# Altium footprint library DrPCB.PcbLib: 910 footprints (part 18 of 57)
Each footprint in its own frame and in the unit in brackets; x right, y up, seen from the top. Pads: shape width x height; smd on the part's side, far side on the other; paste and mask are expansions set on the pad; w line width, h text height; cw(c..) or ccw(c..) is an arc to the next point about the centre after c.
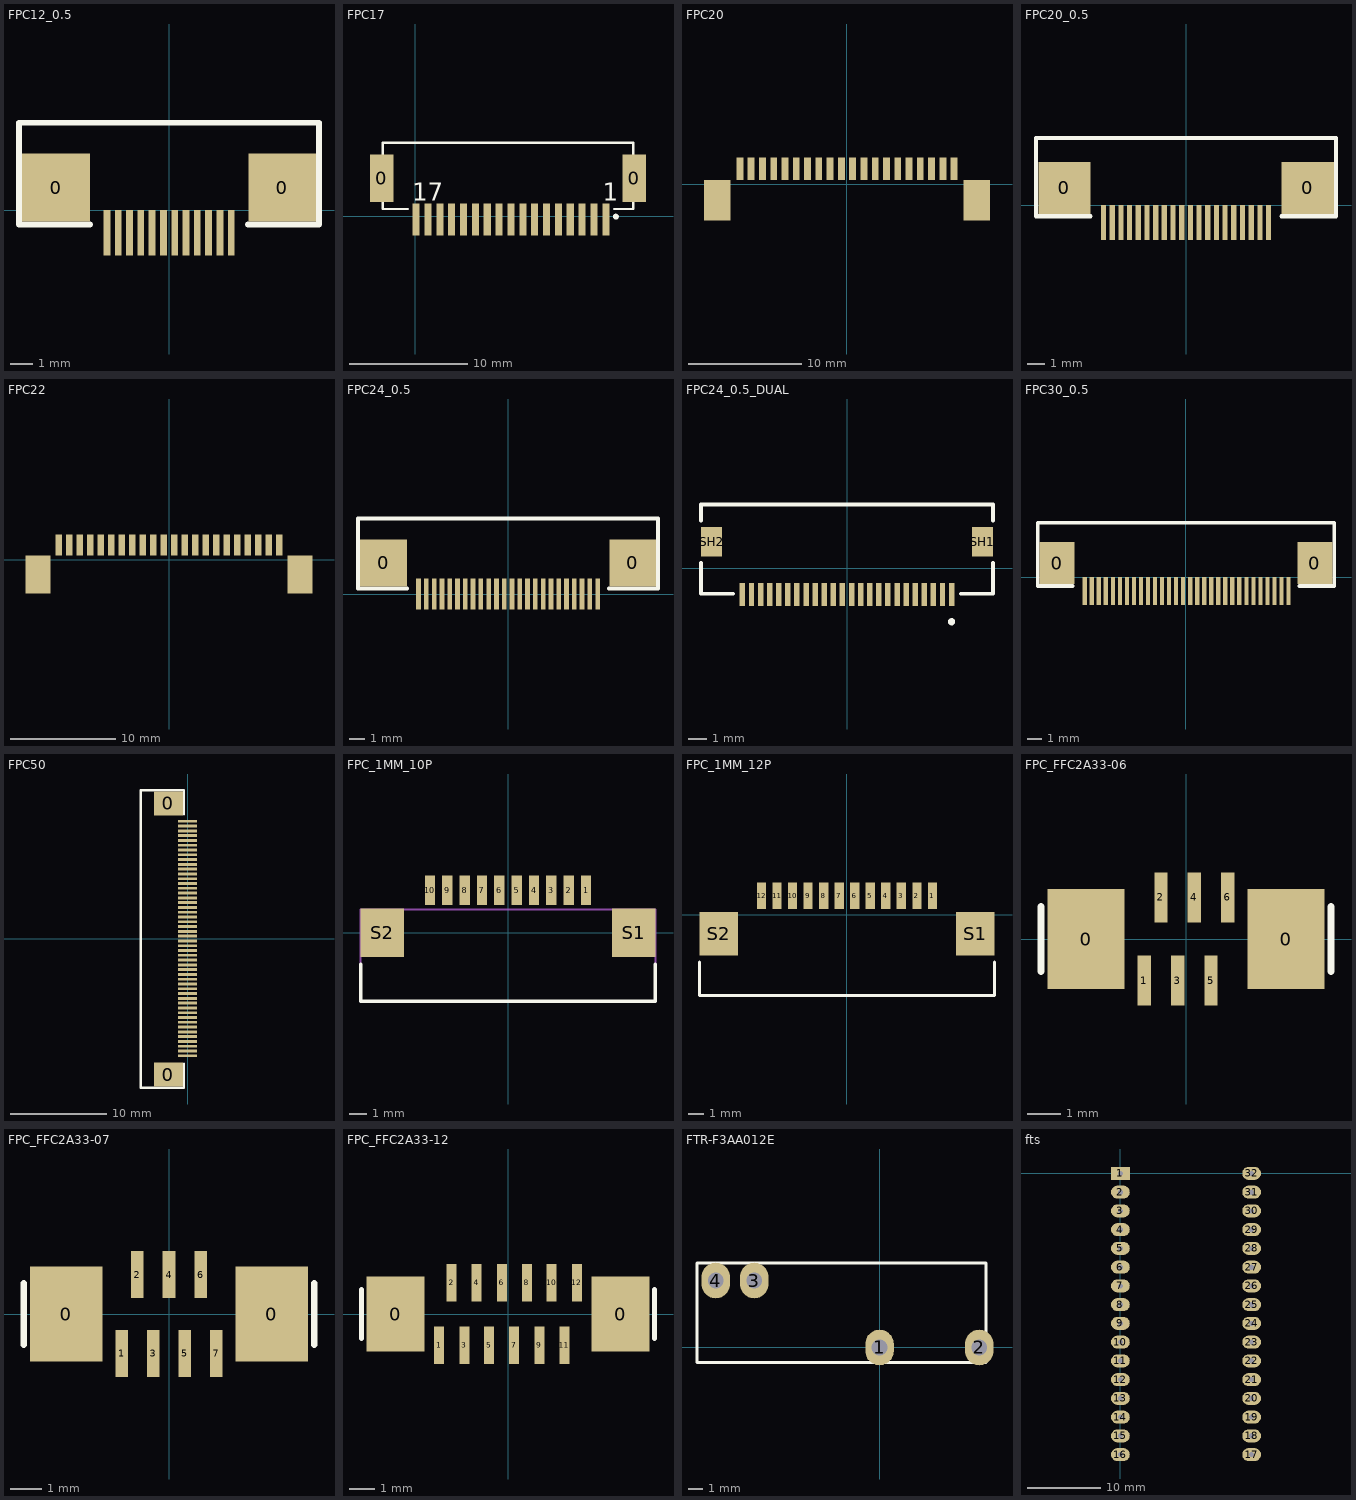
[diagram p17: the footprints below, top view; thin cyan lines are the x and y axes]

## FPC12_0.5 [mm]
pads (14):
  rect 3x3 smd: 0(-5.003,1) 0(5.003,1)
  rect 0.3x2 smd: 1(-2.753,-1) 2(-2.253,-1) 3(-1.753,-1) 4(-1.253,-1) 5(-0.753,-1) 6(-0.253,-1) 7(0.247,-1) 8(0.747,-1) 9(1.247,-1) 10(1.747,-1) 11(2.247,-1) 12(2.747,-1)
Top Overlay:
  lines w0.254: -6.642,3.868 -6.642,-0.632 -3.505,-0.632 ; -6.636,3.868 6.617,3.868 ; 3.492,-0.632 6.629,-0.632 6.629,3.868
3D body "ffc_fpc_affc20-12-050-shb-t.stp": height 2.11, standoff 0.01, extent -5.76,-1.295 5.74,4.04

## FPC17 [mm]
pads (19):
  rect 2x4 smd: 0(-2.84,3.213) 0(18.461,3.213)
  rect 0.6x2.7 smd: 1(16.06,-0.266) 2(15.06,-0.266) 3(14.06,-0.266) 4(13.06,-0.266) 5(12.06,-0.266) 6(11.06,-0.266) 7(10.06,-0.266) 8(9.06,-0.266) 9(8.06,-0.266) 10(7.06,-0.266) 11(6.06,-0.266) 12(5.06,-0.266) 13(4.06,-0.266) 14(3.06,-0.266) 15(2.06,-0.266) 16(1.06,-0.266) 17(0.06,-0.266)
Top Overlay:
  circle w0.25: c16.91,-0.038 r0.125
  lines w0.2: -2.74,1.206 -2.74,0.613 -0.64,0.613 ; -2.74,5.22 -2.74,6.212 18.36,6.212 18.36,5.22 ; 16.761,0.613 18.361,0.613 18.36,1.206
  text "17" at -0.254,1.295 h1.5
  text "1" at 15.811,1.295 h1.5

## FPC20 [mm]
pads (22):
  rect 0.61x2 smd: 1(-9.5,1.4) 2(-8.5,1.4) 3(-7.5,1.4) 4(-6.5,1.4) 5(-5.5,1.4) 6(-4.5,1.4) 7(-3.5,1.4) 8(-2.5,1.4) 9(-1.5,1.4) 10(-0.5,1.4) 11(0.5,1.4) 12(1.5,1.4) 13(2.5,1.4) 14(3.5,1.4) 15(4.5,1.4) 16(5.5,1.4) 17(6.5,1.4) 18(7.5,1.4) 19(8.5,1.4) 20(9.5,1.4)
  rect 2.38x3.6 smd: ""(-11.5,-1.4) ""(11.5,-1.4)

## FPC20_0.5 [mm]
pads (22):
  rect 3x3 smd: 0(-7.003,1) 0(7.003,1)
  rect 0.3x2 smd: 1(-4.753,-1) 2(-4.253,-1) 3(-3.753,-1) 4(-3.253,-1) 5(-2.753,-1) 6(-2.253,-1) 7(-1.753,-1) 8(-1.253,-1) 9(-0.753,-1) 10(-0.253,-1) 11(0.247,-1) 12(0.747,-1) 13(1.247,-1) 14(1.747,-1) 15(2.247,-1) 16(2.747,-1) 17(3.247,-1) 18(3.747,-1) 19(4.247,-1) 20(4.747,-1)
Top Overlay:
  lines w0.254: -5.505,-0.632 -8.642,-0.632 -8.642,3.868 8.617,3.868 ; 5.493,-0.632 8.63,-0.632 8.63,3.868
3D body "ffc_fpc_affc20-20-050-shb-t.stp": height 2.06, standoff -0.04, extent -7.753,-1.437 7.747,3.899

## FPC22 [mm]
pads (24):
  rect 0.61x2 smd: 1(-10.5,1.406) 2(-9.5,1.406) 3(-8.5,1.406) 4(-7.5,1.406) 5(-6.5,1.406) 6(-5.5,1.406) 7(-4.5,1.406) 8(-3.5,1.406) 9(-2.5,1.406) 10(-1.5,1.406) 11(-0.5,1.406) 12(0.5,1.406) 13(1.5,1.406) 14(2.5,1.406) 15(3.5,1.406) 16(4.5,1.406) 17(5.5,1.406) 18(6.5,1.406) 19(7.5,1.406) 20(8.5,1.394) 21(9.5,1.394) 22(10.5,1.394)
  rect 2.38x3.6 smd: ""(-12.5,-1.394) ""(12.5,-1.406)

## FPC24_0.5 [mm]
pads (26):
  rect 3x3 smd: 0(-8,2) 0(8,2)
  rect 0.3x2 smd: 1(-5.75,0) 2(-5.25,0) 3(-4.75,0) 4(-4.25,0) 5(-3.75,0) 6(-3.25,0) 7(-2.75,0) 8(-2.25,0) 9(-1.75,0) 10(-1.25,0) 11(-0.75,0) 12(-0.25,0) 13(0.25,0) 14(0.75,0) 15(1.25,0) 16(1.75,0) 17(2.25,0) 18(2.75,0) 19(3.25,0) 20(3.75,0) 21(4.25,0) 22(4.75,0) 23(5.25,0) 24(5.75,0)
Top Overlay:
  lines w0.254: -6.502,0.368 -9.639,0.368 -9.639,4.868 9.627,4.868 9.627,0.368 6.49,0.368
3D body "ffc_fpc_affc20-24-050-shb-t.stp": height 2.11, standoff 0.01, extent -8.756,-0.34 8.744,4.995

## FPC24_0.5_DUAL [mm]
pads (26):
  rect 0.3x1.25 smd mask+0.05: 1(5.75,-1.448) 2(5.25,-1.448) 3(4.75,-1.448) 4(4.25,-1.448) 5(3.75,-1.448) 6(3.25,-1.448) 7(2.75,-1.448) 8(2.25,-1.448) 9(1.75,-1.448) 10(1.25,-1.448) 11(0.75,-1.448) 12(0.25,-1.448) 13(-0.25,-1.448) 14(-0.75,-1.448) 15(-1.25,-1.448) 16(-1.75,-1.448) 17(-2.25,-1.448) 18(-2.75,-1.448) 19(-3.25,-1.448) 20(-3.75,-1.448) 21(-4.25,-1.448) 22(-4.75,-1.448) 23(-5.25,-1.448) 24(-5.75,-1.448)
  rect 1.15x1.6 smd: SH1(7.445,1.448) SH2(-7.445,1.448)
Top Overlay:
  circle w0.2: c5.75,-2.947 r0.1
  lines w0.2: -8.025,0.298 -8.025,-1.402 -6.25,-1.402 ; -8.025,2.598 -8.025,3.497 8.025,3.497 8.025,2.598 ; 6.25,-1.402 8.025,-1.402 8.025,0.298
3D body "FFC2B29-24-G.stp": height 3.66, standoff -0.05, extent -8.026,-1.772 8.024,3.499

## FPC30_0.5 [mm]
pads (32):
  rect 2.5x3 smd: 0(-9.174,0.997) 0(9.174,0.997)
  rect 0.3x2 smd: 1(-7.204,-0.997) 2(-6.704,-0.997) 3(-6.204,-0.997) 4(-5.704,-0.997) 5(-5.204,-0.997) 6(-4.704,-0.997) 7(-4.204,-0.997) 8(-3.704,-0.997) 9(-3.204,-0.997) 10(-2.704,-0.997) 11(-2.204,-0.997) 12(-1.704,-0.997) 13(-1.204,-0.997) 14(-0.704,-0.997) 15(-0.204,-0.997) 16(0.296,-0.997) 17(0.796,-0.997) 18(1.296,-0.997) 19(1.796,-0.997) 20(2.296,-0.997) 21(2.796,-0.997) 22(3.296,-0.997) 23(3.796,-0.997) 24(4.296,-0.997) 25(4.796,-0.997) 26(5.296,-0.997) 27(5.796,-0.997) 28(6.296,-0.997) 29(6.796,-0.997) 30(7.296,-0.997)
Top Overlay:
  lines w0.254: -10.555,-0.633 -10.555,3.867 ; -10.555,-0.629 -8.047,-0.629 ; -10.549,3.871 10.545,3.871 ; 8.043,-0.629 10.551,-0.629 10.551,3.871
3D body "User Library-FPC0_5MM4_6H30P-H.step": height 2.01, standoff -0.04, extent -10.762,-1.17 10.838,5.43

## FPC50 [mm]
pads (52):
  rect 3x2.5 smd: 0(-1.994,-14.22) 0(-1.994,14.122)
  rect 2x0.3 smd: 1(0,-12.25) 2(0,-11.75) 3(0,-11.25) 4(0,-10.75) 5(0,-10.25) 6(0,-9.75) 7(0,-9.25) 8(0,-8.75) 9(0,-8.25) 10(0,-7.75) 11(0,-7.25) 12(0,-6.75) 13(0,-6.25) 14(0,-5.75) 15(0,-5.25) 16(0,-4.75) 17(0,-4.25) 18(0,-3.75) 19(0,-3.25) 20(0,-2.75) 21(0,-2.25) 22(0,-1.75) 23(0,-1.25) 24(0,-0.75) 25(0,-0.25) 26(0,0.25) 27(0,0.75) 28(0,1.25) 29(0,1.75) 30(0,2.25) 31(0,2.75) 32(0,3.25) 33(0,3.75) 34(0,4.25) 35(0,4.75) 36(0,5.25) 37(0,5.75) 38(0,6.25) 39(0,6.75) 40(0,7.25) 41(0,7.75) 42(0,8.25) 43(0,8.75) 44(0,9.25) 45(0,9.75) 46(0,10.25) 47(0,10.75) 48(0,11.25) 49(0,11.75) 50(0,12.25)
Top Overlay:
  lines w0.254: -4.868,-15.596 -4.868,15.5 -0.368,15.5 -0.368,12.992 ; -4.864,-15.602 -0.364,-15.602 ; -0.368,-15.602 -0.368,-13.094
3D body "ffc_fpc_affc20-50-050-shb-t.stp": height 2.06, standoff -0.04, extent -4.78,-15.25 0.556,15.25

## FPC_1MM_10P [mm]
pads (12):
  rect 0.6x1.7 smd: 1(4.5,2.45) 2(3.5,2.45) 3(2.5,2.45) 4(1.5,2.45) 5(0.5,2.45) 6(-0.5,2.45) 7(-1.5,2.45) 8(-2.5,2.45) 9(-3.5,2.45) 10(-4.5,2.45)
  rect 2.5x2.8 smd: S1(7.25,0) S2(-7.25,0)
Top Overlay:
  lines w0.2: -8.5,-1.8 -8.5,-3.95 8.5,-3.95 8.5,-1.8
Mechanical 13:
  lines w0.1: -8.5,-4 8.5,-4 ; -8.5,-3.95 -8.5,1.35 8.5,1.35 8.5,-3.95
3D body "68611014122.stp": height 3.01, standoff 0.01, extent -8.5,-4.05 8.5,3.05

## FPC_1MM_12P [mm]
pads (14):
  rect 0.6x1.7 smd: 1(5.497,1.225) 2(4.497,1.225) 3(3.497,1.225) 4(2.497,1.225) 5(1.497,1.225) 6(0.497,1.225) 7(-0.503,1.225) 8(-1.503,1.225) 9(-2.503,1.225) 10(-3.503,1.225) 11(-4.497,1.225) 12(-5.497,1.225)
  rect 2.5x2.8 smd: S1(8.247,-1.225) S2(-8.247,-1.225)
Top Overlay:
  lines w0.2: -9.497,-5.175 -9.497,-3.025 ; -9.493,-3.025 -9.493,-5.175 9.497,-5.175 9.497,-3.025
3D body "1-84953-2.stp": height 2.59, standoff -0.07, extent -9.96,-5.053 9.96,1.497

## FPC_FFC2A33-06 [mm]
pads (8):
  rect 2.3x3 smd paste-0.2: 0(-3,0) 0(3,0)
  rect 0.4x1.5 smd paste-0.05: 1(-1.25,-1.25) 2(-0.75,1.25) 3(-0.25,-1.25) 4(0.25,1.25) 5(0.75,-1.25) 6(1.25,1.25)
Top Overlay:
  lines w0.2: -4.35,-0.975 -4.35,0.975 ; 4.35,-0.975 4.35,0.975
3D body "FFC2A33-06-T-R.stp": height 4.46, standoff -0.04, extent -4.369,-1.6 4.331,1.6

## FPC_FFC2A33-07 [mm]
pads (9):
  rect 2.3x3 smd paste-0.2: 0(-3.25,0) 0(3.25,0)
  rect 0.4x1.5 smd paste-0.05: 1(-1.5,-1.25) 2(-1,1.25) 3(-0.5,-1.25) 4(0,1.25) 5(0.5,-1.25) 6(1,1.25) 7(1.5,-1.25)
Top Overlay:
  lines w0.2: -4.6,-0.975 -4.6,0.975 ; 4.6,-0.975 4.6,0.975
3D body "FFC2A33-07-T-R.stp": height 4.5, standoff 0, extent -4.6,-1.6 4.6,1.6

## FPC_FFC2A33-12 [mm]
pads (14):
  rect 2.3x3 smd paste-0.2: 0(-4.5,0) 0(4.5,0)
  rect 0.4x1.5 smd paste-0.05: 1(-2.75,-1.25) 2(-2.25,1.25) 3(-1.75,-1.25) 4(-1.25,1.25) 5(-0.75,-1.25) 6(-0.25,1.25) 7(0.25,-1.25) 8(0.75,1.25) 9(1.25,-1.25) 10(1.75,1.25) 11(2.25,-1.25) 12(2.75,1.25)
Top Overlay:
  lines w0.2: -5.85,-0.975 -5.85,0.975 ; 5.85,-0.975 5.85,0.975
3D body "FFC2A33-12-T-R.stp": height 4.46, standoff -0.04, extent -5.85,-1.6 5.85,1.6

## FTR-F3AA012E [mm]
pads (4):
  oval 2x2.5 hole 1.1: 1(0,0) 2(7,0) 3(-8.8,4.7) 4(-11.5,4.7)
Top Overlay:
  lines w0.2: -12.82,-1.063 7.48,-1.063 7.48,5.937 -12.82,5.937 -12.82,-1.063
3D body: height 15, standoff 0, extent -12.814,-1.067 7.48,5.931

## fts [mil]
pads (32):
  rect 100x70 hole 28: 1(0,0)
  oval 100x70 hole 28: 2(0,-100) 3(0,-200) 4(0,-300) 5(0,-400) 6(0,-500) 7(0,-600) 8(0,-700) 9(0,-800) 10(0,-900) 11(0,-1000) 12(0,-1100) 13(0,-1200) 14(0,-1300) 15(0,-1400) 16(0,-1500) 17(700,-1500) 18(700,-1400) 19(700,-1300) 20(700,-1200) 21(700,-1100) 22(700,-1000) 23(700,-900) 24(700,-800) 25(700,-700) 26(700,-600) 27(700,-500) 28(700,-400) 29(700,-300) 30(700,-200) 31(700,-100) 32(700,0)